# Altium footprint library Pcblib.PcbLib: 281 footprints (part 8 of 18)
Each footprint in its own frame and in the unit in brackets; x right, y up, seen from the top. Pads: shape width x height; smd on the part's side, far side on the other; paste and mask are expansions set on the pad; w line width, h text height; cw(c..) or ccw(c..) is an arc to the next point about the centre after c.
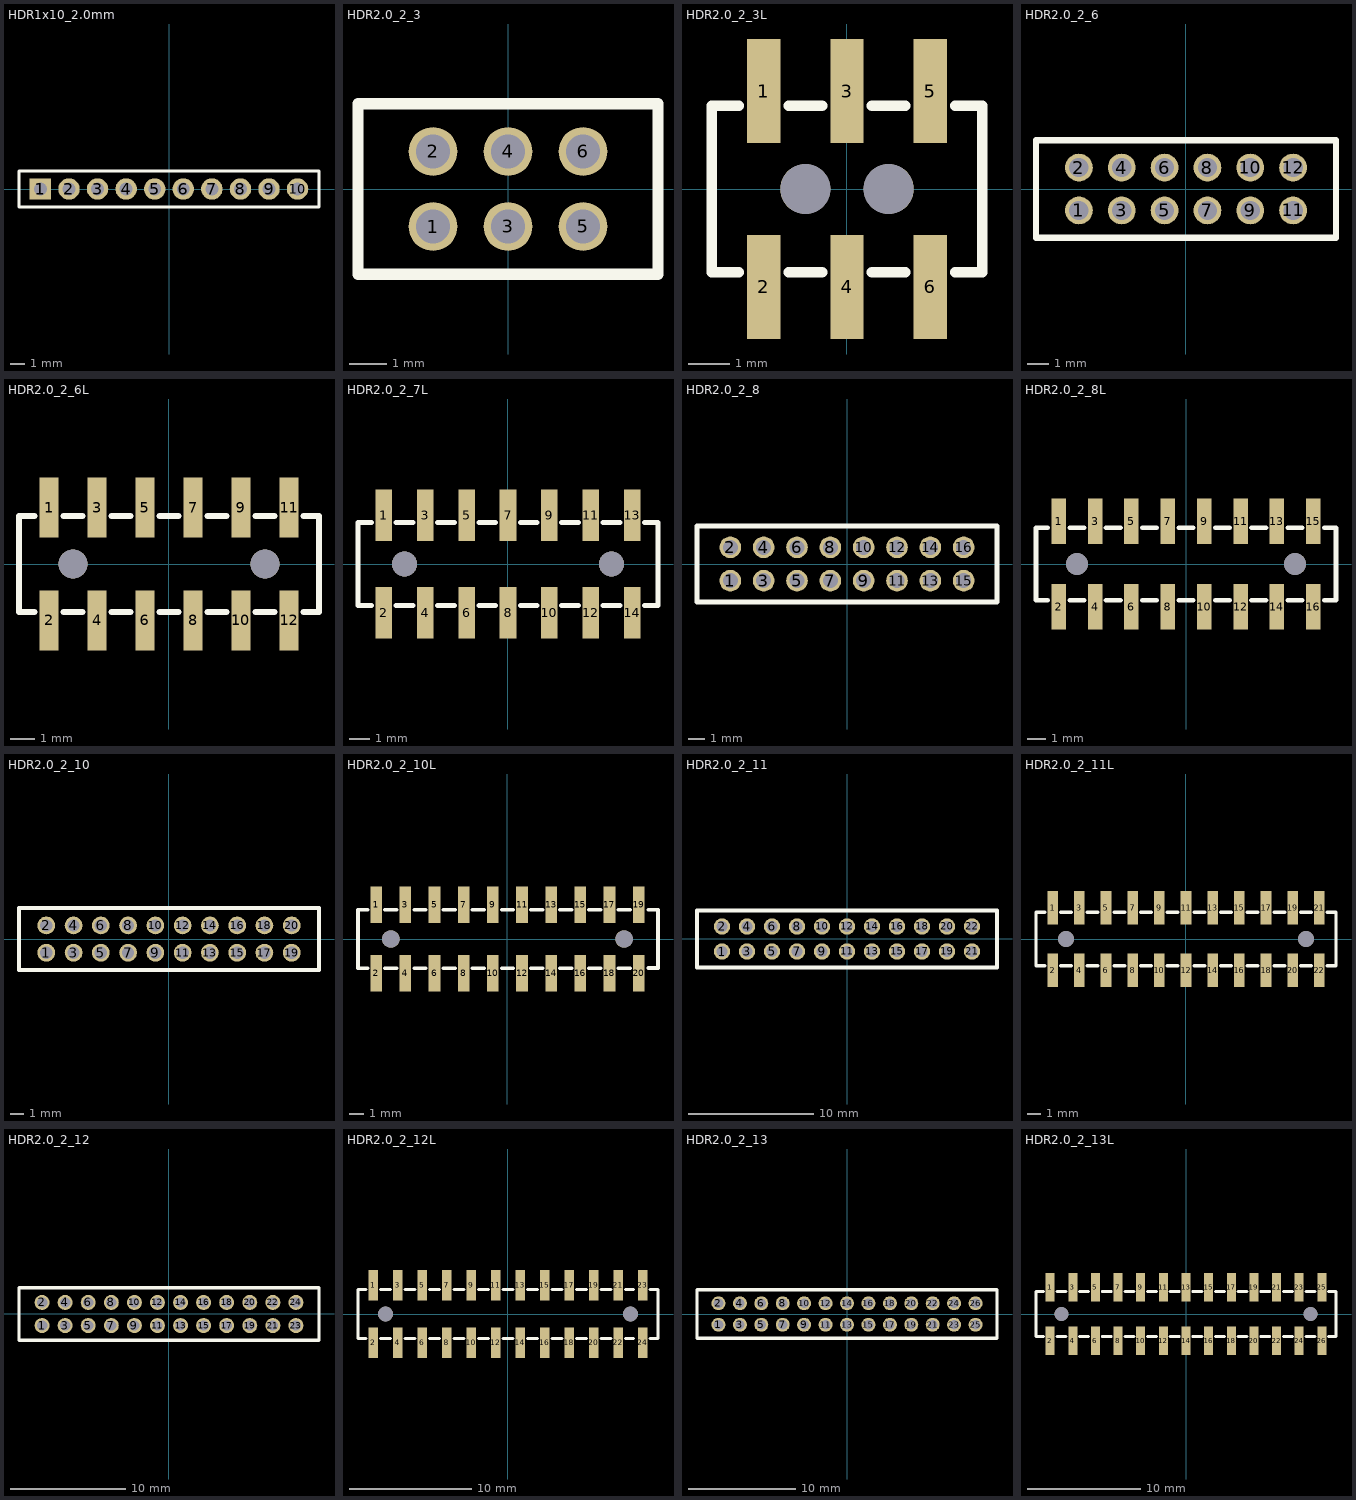
[diagram p7: the footprints below, top view; thin cyan lines are the x and y axes]

## HDR1x10_2.0mm [mm] "Connector; Header; 10 Position"
pads (10):
  rect 1.5x1.5 hole 0.9: 1(-9,0)
  round 1.5 hole 0.9: 2(-7,0) 3(-5,0) 4(-3,0) 5(-1,0) 6(1,0) 7(3,0) 8(5,0) 9(7,0) 10(9,0)
Top Overlay:
  lines w0.2: -10.5,-1.27 10.5,-1.27 10.5,1.27 -10.5,1.27 -10.5,-1.27

## HDR2.0_2_3 [mm] "Connector; Header; 7x2 Position"
pads (6):
  round 1.3 hole 0.9: 1(-2,-1) 2(-2,1) 3(0,-1) 4(0,1) 5(2,-1) 6(2,1)
Top Overlay:
  lines w0.3: -4,-2.27 -4,2.27 4,2.27 4,-2.27 -4,-2.27

## HDR2.0_2_3L [mm]
pads (8):
  rect 0.8x2.5 smd: 1(-2,2.35) 2(-2,-2.35) 3(0,2.35) 4(0,-2.35) 5(2,2.35) 6(2,-2.35)
  round 1.2 hole 1.2 unplated: ""(-1,0) ""(1,0)
Top Overlay:
  lines w0.254: -2.6,-2 -3.25,-2 -3.25,2 -2.6,2 ; -1.4,-2 -0.6,-2 ; -1.4,2 -0.6,2 ; 0.6,-2 1.4,-2 ; 0.6,2 1.4,2 ; 2.6,-2 3.25,-2 3.25,2 2.6,2

## HDR2.0_2_6 [mm] "Connector; Header; 7x2 Position"
pads (12):
  round 1.3 hole 0.9: 1(-5,-1) 2(-5,1) 3(-3,-1) 4(-3,1) 5(-1,-1) 6(-1,1) 7(1,-1) 8(1,1) 9(3,-1) 10(3,1) 11(5,-1) 12(5,1)
Top Overlay:
  lines w0.3: -7,-2.27 7,-2.27 7,2.27 -7,2.27 -7,-2.27

## HDR2.0_2_6L [mm]
pads (14):
  rect 0.8x2.5 smd: 1(-5,2.35) 2(-5,-2.35) 3(-3,2.35) 4(-3,-2.35) 5(-1,2.35) 6(-1,-2.35) 7(1,2.35) 8(1,-2.35) 9(3,2.35) 10(3,-2.35) 11(5,2.35) 12(5,-2.35)
  round 1.2 hole 1.2 unplated: ""(-4,0) ""(4,0)
Top Overlay:
  lines w0.254: -5.6,-2 -6.25,-2 -6.25,2 -5.6,2 ; -4.4,-2 -3.6,-2 ; -4.4,2 -3.6,2 ; -2.4,-2 -1.6,-2 ; -2.4,2 -1.6,2 ; -0.4,-2 0.4,-2 ; -0.4,2 0.4,2 ; 1.6,-2 2.4,-2 ; 1.6,2 2.4,2 ; 3.6,-2 4.4,-2 ; 3.6,2 4.4,2 ; 5.6,-2 6.25,-2 6.25,2 5.6,2

## HDR2.0_2_7L [mm]
pads (16):
  rect 0.8x2.5 smd: 1(-6,2.35) 2(-6,-2.35) 3(-4,2.35) 4(-4,-2.35) 5(-2,2.35) 6(-2,-2.35) 7(0,2.35) 8(0,-2.35) 9(2,2.35) 10(2,-2.35) 11(4,2.35) 12(4,-2.35) 13(6,2.35) 14(6,-2.35)
  round 1.2 hole 1.2 unplated: ""(-5,0) ""(5,0)
Top Overlay:
  lines w0.254: -6.6,-2 -7.25,-2 -7.25,2 -6.6,2 ; -5.4,-2 -4.6,-2 ; -5.4,2 -4.6,2 ; -3.4,-2 -2.6,-2 ; -3.4,2 -2.6,2 ; -1.4,-2 -0.6,-2 ; -1.4,2 -0.6,2 ; 0.6,-2 1.4,-2 ; 0.6,2 1.4,2 ; 2.6,-2 3.4,-2 ; 2.6,2 3.4,2 ; 4.6,-2 5.4,-2 ; 4.6,2 5.4,2 ; 6.6,-2 7.25,-2 7.25,2 6.6,2

## HDR2.0_2_8 [mm] "Connector; Header; 7x2 Position"
pads (16):
  round 1.3 hole 0.9: 1(-7,-1) 2(-7,1) 3(-5,-1) 4(-5,1) 5(-3,-1) 6(-3,1) 7(-1,-1) 8(-1,1) 9(1,-1) 10(1,1) 11(3,-1) 12(3,1) 13(5,-1) 14(5,1) 15(7,-1) 16(7,1)
Top Overlay:
  lines w0.3: -9,-2.27 9,-2.27 9,2.27 -9,2.27 -9,-2.27

## HDR2.0_2_8L [mm]
pads (18):
  rect 0.8x2.5 smd: 1(-7,2.35) 2(-7,-2.35) 3(-5,2.35) 4(-5,-2.35) 5(-3,2.35) 6(-3,-2.35) 7(-1,2.35) 8(-1,-2.35) 9(1,2.35) 10(1,-2.35) 11(3,2.35) 12(3,-2.35) 13(5,2.35) 14(5,-2.35) 15(7,2.35) 16(7,-2.35)
  round 1.2 hole 1.2 unplated: ""(-6,0) ""(6,0)
Top Overlay:
  lines w0.254: -7.6,-2 -8.25,-2 -8.25,2 -7.6,2 ; -6.4,-2 -5.6,-2 ; -6.4,2 -5.6,2 ; -4.4,-2 -3.6,-2 ; -4.4,2 -3.6,2 ; -2.4,-2 -1.6,-2 ; -2.4,2 -1.6,2 ; -0.4,-2 0.4,-2 ; -0.4,2 0.4,2 ; 1.6,-2 2.4,-2 ; 1.6,2 2.4,2 ; 3.6,-2 4.4,-2 ; 3.6,2 4.4,2 ; 5.6,-2 6.4,-2 ; 5.6,2 6.4,2 ; 7.6,-2 8.25,-2 8.25,2 7.6,2

## HDR2.0_2_10 [mm] "Connector; Header; 7x2 Position"
pads (20):
  round 1.3 hole 0.9: 1(-9,-1) 2(-9,1) 3(-7,-1) 4(-7,1) 5(-5,-1) 6(-5,1) 7(-3,-1) 8(-3,1) 9(-1,-1) 10(-1,1) 11(1,-1) 12(1,1) 13(3,-1) 14(3,1) 15(5,-1) 16(5,1) 17(7,-1) 18(7,1) 19(9,-1) 20(9,1)
Top Overlay:
  lines w0.3: 11,-2.27 -11,-2.27 -11,2.27 11,2.27 ; 11,-2.261 11,2.279

## HDR2.0_2_10L [mm]
pads (22):
  rect 0.8x2.5 smd: 1(-9,2.35) 2(-9,-2.35) 3(-7,2.35) 4(-7,-2.35) 5(-5,2.35) 6(-5,-2.35) 7(-3,2.35) 8(-3,-2.35) 9(-1,2.35) 10(-1,-2.35) 11(1,2.35) 12(1,-2.35) 13(3,2.35) 14(3,-2.35) 15(5,2.35) 16(5,-2.35) 17(7,2.35) 18(7,-2.35) 19(9,2.35) 20(9,-2.35)
  round 1.2 hole 1.2 unplated: ""(-8,0) ""(8,0)
Top Overlay:
  lines w0.254: -9.6,-2 -10.25,-2 -10.25,2 -9.6,2 ; -8.4,-2 -7.6,-2 ; -8.4,2 -7.6,2 ; -6.4,-2 -5.6,-2 ; -6.4,2 -5.6,2 ; -4.4,-2 -3.6,-2 ; -4.4,2 -3.6,2 ; -2.4,-2 -1.6,-2 ; -2.4,2 -1.6,2 ; -0.4,-2 0.4,-2 ; -0.4,2 0.4,2 ; 1.6,-2 2.4,-2 ; 1.6,2 2.4,2 ; 3.6,-2 4.4,-2 ; 3.6,2 4.4,2 ; 5.6,-2 6.4,-2 ; 5.6,2 6.4,2 ; 7.6,-2 8.4,-2 ; 7.6,2 8.4,2 ; 9.677,-1.993 10.327,-1.993 10.327,2.007 9.677,2.007

## HDR2.0_2_11 [mm] "Connector; Header; 7x2 Position"
pads (22):
  round 1.3 hole 0.9: 1(-10,-1) 2(-10,1) 3(-8,-1) 4(-8,1) 5(-6,-1) 6(-6,1) 7(-4,-1) 8(-4,1) 9(-2,-1) 10(-2,1) 11(0,-1) 12(0,1) 13(2,-1) 14(2,1) 15(4,-1) 16(4,1) 17(6,-1) 18(6,1) 19(8,-1) 20(8,1) 21(10,-1) 22(10,1)
Top Overlay:
  lines w0.3: -12,-2.27 -12,2.27 12,2.27 12,-2.27 -12,-2.27

## HDR2.0_2_11L [mm]
pads (24):
  rect 0.8x2.5 smd: 1(-10,2.35) 2(-10,-2.35) 3(-8,2.35) 4(-8,-2.35) 5(-6,2.35) 6(-6,-2.35) 7(-4,2.35) 8(-4,-2.35) 9(-2,2.35) 10(-2,-2.35) 11(0,2.35) 12(0,-2.35) 13(2,2.35) 14(2,-2.35) 15(4,2.35) 16(4,-2.35) 17(6,2.35) 18(6,-2.35) 19(8,2.35) 20(8,-2.35) 21(10,2.35) 22(10,-2.35)
  round 1.2 hole 1.2 unplated: ""(-9,0) ""(9,0)
Top Overlay:
  lines w0.254: -10.6,-2 -11.25,-2 -11.25,2 -10.6,2 ; -9.4,-2 -8.6,-2 ; -9.4,2 -8.6,2 ; -7.4,-2 -6.6,-2 ; -7.4,2 -6.6,2 ; -5.4,-2 -4.6,-2 ; -5.4,2 -4.6,2 ; -3.4,-2 -2.6,-2 ; -3.4,2 -2.6,2 ; -1.4,-2 -0.6,-2 ; -1.4,2 -0.6,2 ; 0.6,-2 1.4,-2 ; 0.6,2 1.4,2 ; 2.6,-2 3.4,-2 ; 2.6,2 3.4,2 ; 4.6,-2 5.4,-2 ; 4.6,2 5.4,2 ; 6.6,-2 7.4,-2 ; 6.6,2 7.4,2 ; 8.6,-2 9.4,-2 ; 8.6,2 9.4,2 ; 10.6,-2 11.25,-2 11.25,2 10.6,2

## HDR2.0_2_12 [mm] "Connector; Header; 7x2 Position"
pads (24):
  round 1.3 hole 0.9: 1(-11,-1) 2(-11,1) 3(-9,-1) 4(-9,1) 5(-7,-1) 6(-7,1) 7(-5,-1) 8(-5,1) 9(-3,-1) 10(-3,1) 11(-1,-1) 12(-1,1) 13(1,-1) 14(1,1) 15(3,-1) 16(3,1) 17(5,-1) 18(5,1) 19(7,-1) 20(7,1) 21(9,-1) 22(9,1) 23(11,-1) 24(11,1)
Top Overlay:
  lines w0.3: -13,-2.27 13,-2.27 13,2.27 -13,2.27 -13,-2.27

## HDR2.0_2_12L [mm]
pads (26):
  rect 0.8x2.5 smd: 1(-11,2.35) 2(-11,-2.35) 3(-9,2.35) 4(-9,-2.35) 5(-7,2.35) 6(-7,-2.35) 7(-5,2.35) 8(-5,-2.35) 9(-3,2.35) 10(-3,-2.35) 11(-1,2.35) 12(-1,-2.35) 13(1,2.35) 14(1,-2.35) 15(3,2.35) 16(3,-2.35) 17(5,2.35) 18(5,-2.35) 19(7,2.35) 20(7,-2.35) 21(9,2.35) 22(9,-2.35) 23(11,2.35) 24(11,-2.35)
  round 1.2 hole 1.2 unplated: ""(-10,0) ""(10,0)
Top Overlay:
  lines w0.254: -11.6,-2 -12.25,-2 -12.25,2 -11.6,2 ; -10.4,-2 -9.6,-2 ; -10.4,2 -9.6,2 ; -8.4,-2 -7.6,-2 ; -8.4,2 -7.6,2 ; -6.4,-2 -5.6,-2 ; -6.4,2 -5.6,2 ; -4.4,-2 -3.6,-2 ; -4.4,2 -3.6,2 ; -2.4,-2 -1.6,-2 ; -2.4,2 -1.6,2 ; -0.4,-2 0.4,-2 ; -0.4,2 0.4,2 ; 1.6,-2 2.4,-2 ; 1.6,2 2.4,2 ; 3.6,-2 4.4,-2 ; 3.6,2 4.4,2 ; 5.6,-2 6.4,-2 ; 5.6,2 6.4,2 ; 7.6,-2 8.4,-2 ; 7.6,2 8.4,2 ; 9.6,-2 10.25,-2 ; 9.6,2 10.25,2 ; 11.6,-2 12.25,-2 12.25,2 11.6,2

## HDR2.0_2_13 [mm] "Connector; Header; 7x2 Position"
pads (26):
  round 1.3 hole 0.9: 1(-12,-1) 2(-12,1) 3(-10,-1) 4(-10,1) 5(-8,-1) 6(-8,1) 7(-6,-1) 8(-6,1) 9(-4,-1) 10(-4,1) 11(-2,-1) 12(-2,1) 13(0,-1) 14(0,1) 15(2,-1) 16(2,1) 17(4,-1) 18(4,1) 19(6,-1) 20(6,1) 21(8,-1) 22(8,1) 23(10,-1) 24(10,1) 25(12,-1) 26(12,1)
Top Overlay:
  lines w0.3: -14,-2.27 14,-2.27 14,2.27 -14,2.27 -14,-2.27

## HDR2.0_2_13L [mm]
pads (28):
  rect 0.8x2.5 smd: 1(-12,2.35) 2(-12,-2.35) 3(-10,2.35) 4(-10,-2.35) 5(-8,2.35) 6(-8,-2.35) 7(-6,2.35) 8(-6,-2.35) 9(-4,2.35) 10(-4,-2.35) 11(-2,2.35) 12(-2,-2.35) 13(0,2.35) 14(0,-2.35) 15(2,2.35) 16(2,-2.35) 17(4,2.35) 18(4,-2.35) 19(6,2.35) 20(6,-2.35) 21(8,2.35) 22(8,-2.35) 23(10,2.35) 24(10,-2.35) 25(12,2.35) 26(12,-2.35)
  round 1.2 hole 1.2 unplated: ""(-11,0) ""(11,0)
Top Overlay:
  lines w0.254: -12.6,-2 -13.25,-2 -13.25,2 -12.6,2 ; -11.4,-2 -10.6,-2 ; -11.4,2 -10.6,2 ; -9.4,-2 -8.6,-2 ; -9.4,2 -8.6,2 ; -7.4,-2 -6.6,-2 ; -7.4,2 -6.6,2 ; -5.4,-2 -4.6,-2 ; -5.4,2 -4.6,2 ; -3.4,-2 -2.6,-2 ; -3.4,2 -2.6,2 ; -1.4,-2 -0.6,-2 ; -1.4,2 -0.6,2 ; 0.6,-2 1.4,-2 ; 0.6,2 1.4,2 ; 2.6,-2 3.4,-2 ; 2.6,2 3.4,2 ; 4.6,-2 5.4,-2 ; 4.6,2 5.4,2 ; 6.6,-2 7.4,-2 ; 6.6,2 7.4,2 ; 8.6,-2 9.4,-2 ; 8.6,2 9.4,2 ; 10.6,-2 11.4,-2 ; 10.6,2 11.4,2 ; 12.6,-2 13.25,-2 13.25,2 12.6,2